# Altium footprint library 电感.PcbLib: 109 footprints (part 5 of 7)
Each footprint in its own frame and in the unit in brackets; x right, y up, seen from the top. Pads: shape width x height; smd on the part's side, far side on the other; paste and mask are expansions set on the pad; w line width, h text height; cw(c..) or ccw(c..) is an arc to the next point about the centre after c.
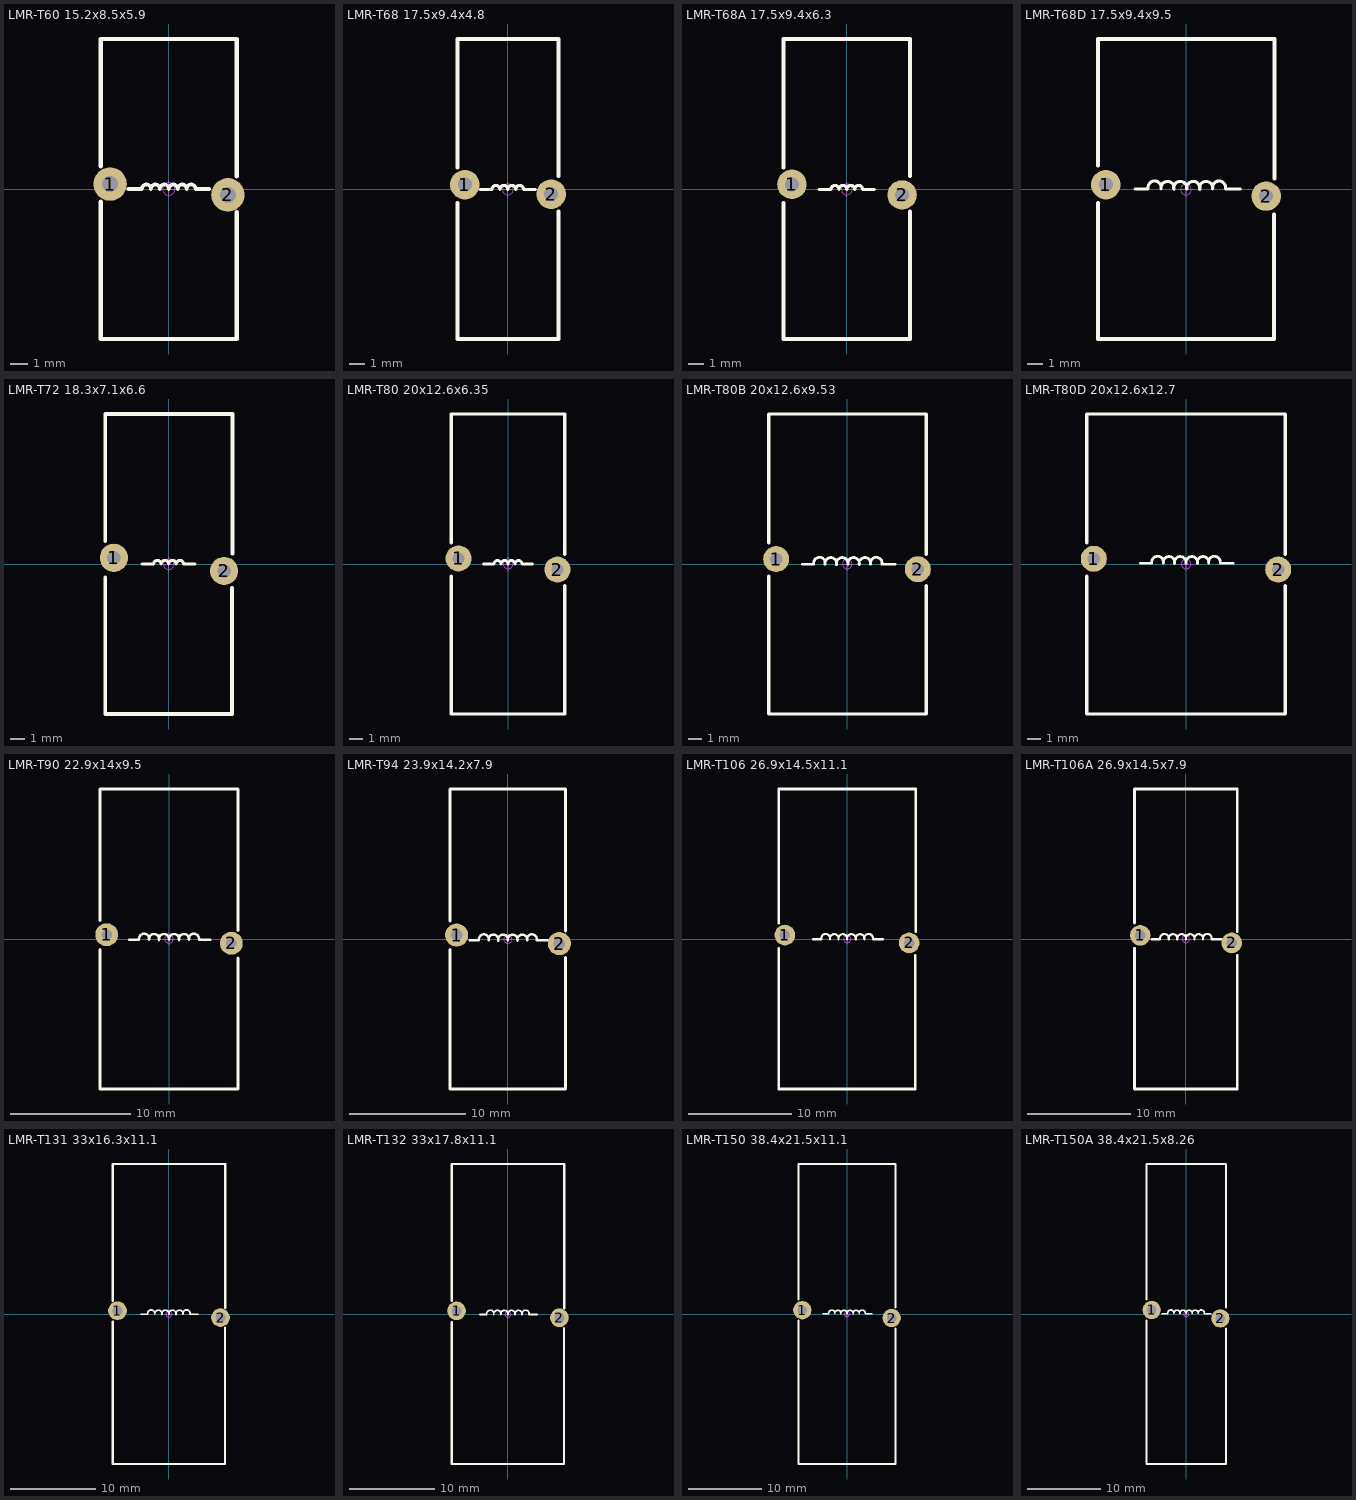
[diagram p4: the footprints below, top view; thin cyan lines are the x and y axes]

## LMR-T60 15.2x8.5x5.9 [mm] "磁环  外：15.2mm，内：8.5mm，厚：5.9mm"
pads (2):
  round 1.9 hole 0.9: 1(-3.327,0.279) 2(3.353,-0.33)
Top Overlay:
  lines w0.203: -2.286,0 -1.524,0 cw(c-1.27,0) -1.016,0 cw(c-0.762,0) -0.508,0 cw(c-0.254,0) 0,0 cw(c0.254,0) 0.508,0 cw(c0.762,0) 1.016,0 cw(c1.27,0) 1.524,0 2.286,0
  lines w0.254: -3.861,-0.711 -3.861,-8.509 3.861,-8.509 3.861,-1.321 ; -3.861,1.295 -3.861,8.509 3.861,8.509 3.861,0.737
Mechanical 15:
  circle w0.05: c0,0 r0.35
  lines w0.05: -0.5,0 0.5,0 ; 0,-0.5 0,0.5
3D body: height 16.81, standoff -2.3, extent -3.711,-8.36 3.711,8.359
3D body: height 0.25, standoff 0, extent 0.33,0.051 0.33,0.051

## LMR-T68 17.5x9.4x4.8 [mm] "磁环  外：17.5mm，内：9.4mm，厚：4.8mm"
pads (2):
  round 1.9 hole 0.9: 1(-2.769,0.305) 2(2.794,-0.305)
Top Overlay:
  lines w0.203: -1.778,0 -1.016,0 cw(c-0.762,0) -0.508,0 cw(c-0.254,0) 0,0 cw(c0.254,0) 0.508,0 cw(c0.762,0) 1.016,0 1.778,0
  lines w0.254: -3.251,-0.889 -3.251,-9.627 3.251,-9.627 3.251,-1.422 ; -3.251,1.422 -3.251,9.677 3.251,9.677 3.251,0.864
Mechanical 15:
  circle w0.05: c0,0 r0.35
  lines w0.05: -0.5,0 0.5,0 ; 0,-0.5 0,0.5
3D body: height 19.11, standoff -2.3, extent -3.161,-9.504 3.162,9.508
3D body: height 0.25, standoff 0, extent 0.33,0.051 0.33,0.051

## LMR-T68A 17.5x9.4x6.3 [mm] "磁环  外：17.5mm，内：9.4mm，厚：6.3mm"
pads (2):
  round 1.9 hole 0.9: 1(-3.531,0.33) 2(3.556,-0.356)
Top Overlay:
  lines w0.203: -1.778,0 -1.016,0 cw(c-0.762,0) -0.508,0 cw(c-0.254,0) 0,0 cw(c0.254,0) 0.508,0 cw(c0.762,0) 1.016,0 1.778,0
  lines w0.254: -4.064,-0.889 -4.064,-9.627 4.064,-9.627 4.064,-1.422 ; -4.064,1.422 -4.064,9.677 4.064,9.677 4.064,0.864
Mechanical 15:
  circle w0.05: c0,0 r0.35
  lines w0.05: -0.5,0 0.5,0 ; 0,-0.5 0,0.5
3D body: height 0.25, standoff 0, extent 0.33,0.051 0.33,0.051
3D body: height 19.11, standoff -2.3, extent -3.911,-9.51 3.913,9.508

## LMR-T68D 17.5x9.4x9.5 [mm] "磁环  外：17.5mm，内：9.4mm，厚：9.5mm"
pads (2):
  round 1.9 hole 0.9: 1(-5.156,0.305) 2(5.156,-0.432)
Top Overlay:
  lines w0.203: -3.262,0.025 -2.442,0.025 ; -2.442,0.048 cw(c-2.024,0.117) -1.611,0.025 cw(c-1.193,0.095) -0.78,0.003 cw(c-0.367,0.095) 0.051,0.025 cw(c0.468,0.095) 0.882,0.003 cw(c1.295,0.095) 1.712,0.025 cw(c2.126,0.117) 2.543,0.048 ; 2.543,0.025 3.49,0.025
  lines w0.254: -5.664,-0.889 -5.664,-9.627 5.664,-9.627 5.664,-1.6 ; -5.664,1.549 -5.664,9.677 5.69,9.677 5.69,0.711
Mechanical 15:
  circle w0.05: c0,0 r0.35
  lines w0.05: -0.5,0 0.5,0 ; 0,-0.5 0,0.5
3D body: height 19.11, standoff -2.32, extent -5.512,-9.509 5.511,9.509
3D body: height 0.25, standoff 0, extent 0.33,0.051 0.33,0.051

## LMR-T72 18.3x7.1x6.6 [mm] "磁环  外：18.3mm，内：7.1mm，厚：6.6mm"
pads (2):
  round 1.9 hole 0.9: 1(-3.683,0.432) 2(3.734,-0.457)
Top Overlay:
  lines w0.203: -1.778,0 -1.016,0 cw(c-0.762,0) -0.508,0 cw(c-0.254,0) 0,0 cw(c0.254,0) 0.508,0 cw(c0.762,0) 1.016,0 1.778,0
  lines w0.254: -4.267,-0.889 -4.267,-10.084 4.267,-10.084 4.267,-1.6 ; -4.267,1.549 -4.267,10.109 4.293,10.109 4.293,0.711
Mechanical 15:
  circle w0.05: c0,0 r0.35
  lines w0.05: -0.5,0 0.5,0 ; 0,-0.5 0,0.5
3D body: height 19.95, standoff -2.3, extent -4.111,-9.936 4.117,9.949
3D body: height 0.25, standoff 0, extent 0.33,0.051 0.33,0.051

## LMR-T80 20x12.6x6.35 [mm] "磁环  外：20mm，内：12.6mm，厚：6.3mm"
pads (2):
  round 1.9 hole 0.9: 1(-3.607,0.406) 2(3.607,-0.406)
Top Overlay:
  lines w0.203: -1.778,0 -1.016,0 cw(c-0.762,0) -0.508,0 cw(c-0.254,0) 0,0 cw(c0.254,0) 0.508,0 cw(c0.762,0) 1.016,0 1.778,0
  lines w0.254: -4.14,-0.889 -4.14,-10.947 4.14,-10.947 4.14,-1.6 ; -4.14,1.549 -4.14,10.947 4.14,10.947 4.14,0.711
Mechanical 15:
  circle w0.05: c0,0 r0.35
  lines w0.05: -0.5,0 0.5,0 ; 0,-0.5 0,0.5
3D body: height 21.71, standoff -2.3, extent -3.987,-10.808 3.986,10.809
3D body: height 0.25, standoff 0, extent 0.33,0.051 0.33,0.051

## LMR-T80B 20x12.6x9.53 [mm] "磁环  外：20mm，内：12.6mm，厚：9.5mm"
pads (2):
  round 1.9 hole 0.9: 1(-5.182,0.356) 2(5.156,-0.381)
Top Overlay:
  lines w0.203: -3.262,-0.025 -2.442,-0.025 ; -2.442,-0.003 cw(c-2.024,0.066) -1.611,-0.025 cw(c-1.193,0.044) -0.78,-0.048 cw(c-0.367,0.044) 0.051,-0.025 cw(c0.468,0.044) 0.882,-0.048 cw(c1.295,0.044) 1.712,-0.025 cw(c2.126,0.066) 2.543,-0.003 ; 2.543,-0.025 3.49,-0.025
  lines w0.254: -5.74,-0.889 -5.74,-10.947 5.766,-10.947 5.766,-1.6 ; -5.74,1.549 -5.74,10.947 5.766,10.947 5.766,0.711
Mechanical 15:
  circle w0.05: c0,0 r0.35
  lines w0.05: -0.5,0 0.5,0 ; 0,-0.5 0,0.5
3D body: height 0.25, standoff 0, extent 0.33,0.051 0.33,0.051
3D body: height 21.69, standoff -2.3, extent -5.578,-10.809 5.576,10.809

## LMR-T80D 20x12.6x12.7 [mm] "磁环  外：20mm，内：12.6mm，厚：12.7mm"
pads (2):
  round 1.9 hole 0.9: 1(-6.731,0.381) 2(6.731,-0.406)
Top Overlay:
  lines w0.203: -3.313,0.051 -2.492,0.051 ; -2.492,0.073 cw(c-2.075,0.143) -1.662,0.051 cw(c-1.244,0.12) -0.831,0.029 cw(c-0.418,0.12) 0,0.051 cw(c0.418,0.12) 0.831,0.029 cw(c1.244,0.12) 1.662,0.051 cw(c2.075,0.143) 2.492,0.073 ; 2.492,0.051 3.44,0.051
  lines w0.254: -7.239,-0.889 -7.239,-10.947 7.239,-10.947 7.239,-1.6 ; -7.239,1.549 -7.239,10.947 7.239,10.947 7.239,0.711
Mechanical 15:
  circle w0.05: c0,0 r0.35
  lines w0.05: -0.5,0 0.5,0 ; 0,-0.5 0,0.5
3D body: height 0.25, standoff 0, extent 0.33,0.051 0.33,0.051
3D body: height 21.59, standoff -2.3, extent -7.111,-10.759 7.111,10.759

## LMR-T90 22.9x14x9.5 [mm] "磁环  外：22.9mm，内：14mm，厚：9.5mm"
pads (2):
  round 1.9 hole 0.9: 1(-5.182,0.356) 2(5.182,-0.356)
Top Overlay:
  lines w0.203: -3.313,-0.076 -2.492,-0.076 ; -2.492,-0.054 cw(c-2.075,0.016) -1.662,-0.076 cw(c-1.244,-0.007) -0.831,-0.098 cw(c-0.418,-0.007) 0,-0.076 cw(c0.418,-0.007) 0.831,-0.098 cw(c1.244,-0.007) 1.662,-0.076 cw(c2.075,0.016) 2.492,-0.054 ; 2.492,-0.076 3.44,-0.076
  lines w0.254: -5.74,-0.889 -5.74,-12.471 5.74,-12.471 5.74,-1.6 ; -5.74,1.549 -5.74,12.471 5.74,12.471 5.74,0.711
Mechanical 15:
  circle w0.05: c0,0 r0.35
  lines w0.05: -0.5,0 0.5,0 ; 0,-0.5 0,0.5
3D body: height 0.25, standoff 0, extent 0.33,0.051 0.33,0.051
3D body: height 24.71, standoff -2.3, extent -5.614,-12.31 5.613,12.31

## LMR-T94 23.9x14.2x7.9 [mm] "磁环  外：23.9mm，内：14.2mm，厚：7.9mm"
pads (2):
  round 2 hole 1: 1(-4.42,0.356) 2(4.445,-0.381)
Top Overlay:
  lines w0.203: -3.313,-0.102 -2.492,-0.102 ; -2.492,-0.079 cw(c-2.075,-0.01) -1.662,-0.102 cw(c-1.244,-0.032) -0.831,-0.124 cw(c-0.418,-0.032) 0,-0.102 cw(c0.418,-0.032) 0.831,-0.124 cw(c1.244,-0.032) 1.662,-0.102 cw(c2.075,-0.01) 2.492,-0.079 ; 2.492,-0.102 3.44,-0.102
  lines w0.254: -4.978,-0.889 -4.978,-12.929 4.978,-12.929 4.978,-1.6 ; -4.978,1.549 -4.978,12.954 4.978,12.954 4.978,0.711
Mechanical 15:
  circle w0.05: c0,0 r0.35
  lines w0.05: -0.5,0 0.5,0 ; 0,-0.5 0,0.5
3D body: height 25.73, standoff -2.3, extent -4.862,-12.803 4.857,12.816
3D body: height 0.25, standoff 0, extent 0.33,0.051 0.33,0.051

## LMR-T106 26.9x14.5x11.1 [mm] "磁环  外：26.9mm，内：14.5mm，厚：11.1mm"
pads (2):
  round 2 hole 1: 1(-6.02,0.381) 2(5.994,-0.381)
Top Overlay:
  lines w0.203: -3.313,-0.025 -2.492,-0.025 ; -2.492,-0.003 cw(c-2.075,0.066) -1.662,-0.025 cw(c-1.244,0.044) -0.831,-0.048 cw(c-0.418,0.044) 0,-0.025 cw(c0.418,0.044) 0.831,-0.048 cw(c1.244,0.044) 1.662,-0.025 cw(c2.075,0.066) 2.492,-0.003 ; 2.492,-0.025 3.44,-0.025
  lines w0.254: -6.604,-0.889 -6.604,-14.503 6.604,-14.503 6.604,-1.6 ; -6.604,1.549 -6.604,14.503 6.629,14.503 6.629,0.711
Mechanical 15:
  circle w0.05: c0,0 r0.35
  lines w0.05: -0.5,0 0.5,0 ; 0,-0.5 0,0.5
3D body: height 28.81, standoff -2.3, extent -6.461,-14.36 6.463,14.36
3D body: height 0.25, standoff 0, extent 0.33,0.051 0.33,0.051

## LMR-T106A 26.9x14.5x7.9 [mm] "磁环  外：26.9mm，内：14.5mm，厚：7.9mm"
pads (2):
  round 2 hole 1: 1(-4.42,0.356) 2(4.445,-0.381)
Top Overlay:
  lines w0.203: -3.313,-0.025 -2.492,-0.025 ; -2.492,-0.003 cw(c-2.075,0.066) -1.662,-0.025 cw(c-1.244,0.044) -0.831,-0.048 cw(c-0.418,0.044) 0,-0.025 cw(c0.418,0.044) 0.831,-0.048 cw(c1.244,0.044) 1.662,-0.025 cw(c2.075,0.066) 2.492,-0.003 ; 2.492,-0.025 3.44,-0.025
  lines w0.254: -4.978,-0.889 -4.978,-14.529 4.978,-14.529 4.978,-1.6 ; -4.978,1.549 -4.978,14.529 4.978,14.529 4.978,0.711
Mechanical 15:
  circle w0.05: c0,0 r0.35
  lines w0.05: -0.5,0 0.5,0 ; 0,-0.5 0,0.5
3D body: height 0.25, standoff 0, extent 0.33,0.051 0.33,0.051
3D body: height 28.81, standoff -2.3, extent -4.861,-14.36 4.863,14.359

## LMR-T131 33x16.3x11.1 [mm] "磁环  外：33mm，内：16.3mm，厚：11.1mm"
pads (2):
  round 2.2 hole 1.2: 1(-6.045,0.406) 2(6.071,-0.406)
Top Overlay:
  lines w0.203: -3.313,-0.025 -2.492,-0.025 ; -2.492,-0.003 cw(c-2.075,0.066) -1.662,-0.025 cw(c-1.244,0.044) -0.831,-0.048 cw(c-0.418,0.044) 0,-0.025 cw(c0.418,0.044) 0.831,-0.048 cw(c1.244,0.044) 1.662,-0.025 cw(c2.075,0.066) 2.492,-0.003 ; 2.492,-0.025 3.44,-0.025
  lines w0.254: -6.604,-0.889 -6.604,-17.628 6.604,-17.628 6.604,-1.6 ; -6.604,1.549 -6.604,17.653 6.629,17.653 6.629,0.711
Mechanical 15:
  circle w0.05: c0,0 r0.35
  lines w0.05: -0.5,0 0.5,0 ; 0,-0.5 0,0.5
3D body: height 0.25, standoff 0, extent 0.33,0.051 0.33,0.051
3D body: height 35.08, standoff -2.3, extent -6.561,-17.505 6.561,17.501

## LMR-T132 33x17.8x11.1 [mm] "磁环  外：33mm，内：17.8mm，厚：11.1mm"
pads (2):
  round 2.2 hole 1.2: 1(-6.045,0.406) 2(6.071,-0.406)
Top Overlay:
  lines w0.203: -3.313,-0.025 -2.492,-0.025 ; -2.492,-0.003 cw(c-2.075,0.066) -1.662,-0.025 cw(c-1.244,0.044) -0.831,-0.048 cw(c-0.418,0.044) 0,-0.025 cw(c0.418,0.044) 0.831,-0.048 cw(c1.244,0.044) 1.662,-0.025 cw(c2.075,0.066) 2.492,-0.003 ; 2.492,-0.025 3.44,-0.025
  lines w0.254: -6.604,-0.889 -6.604,-17.628 6.604,-17.628 6.604,-1.6 ; -6.604,1.549 -6.604,17.704 6.629,17.704 6.629,0.711
Mechanical 15:
  circle w0.05: c0,0 r0.35
  lines w0.05: -0.5,0 0.5,0 ; 0,-0.5 0,0.5
3D body: height 35.14, standoff -2.3, extent -6.634,-17.545 6.62,17.544
3D body: height 0.25, standoff 0, extent 0.33,0.051 0.33,0.051

## LMR-T150 38.4x21.5x11.1 [mm] "磁环  外：38.4mm，内：21.5mm，厚：11.1mm"
pads (2):
  round 2.5 hole 1.3: 1(-6.096,0.533) 2(6.096,-0.533)
Top Overlay:
  lines w0.203: -3.313,0.025 -2.492,0.025 ; -2.492,0.048 cw(c-2.075,0.117) -1.662,0.025 cw(c-1.244,0.095) -0.831,0.003 cw(c-0.418,0.095) 0,0.025 cw(c0.418,0.095) 0.831,0.003 cw(c1.244,0.095) 1.662,0.025 cw(c2.075,0.117) 2.492,0.048 ; 2.492,0.025 3.44,0.025
  lines w0.254: -6.604,-0.889 -6.604,-20.447 6.604,-20.447 6.604,-1.956 ; -6.604,1.981 -6.604,20.472 6.629,20.472 6.629,0.889
Mechanical 15:
  circle w0.05: c0,0 r0.35
  lines w0.05: -0.5,0 0.5,0 ; 0,-0.5 0,0.5
3D body: height 0.25, standoff 0, extent 0.33,0.051 0.33,0.051
3D body: height 40.71, standoff -2.3, extent -6.661,-20.28 6.661,20.278

## LMR-T150A 38.4x21.5x8.26 [mm] "磁环  外：38.4mm，内：21.5mm，厚：8.26mm"
pads (2):
  round 2.5 hole 1.3: 1(-4.699,0.559) 2(4.674,-0.584)
Top Overlay:
  lines w0.203: -3.313,0.051 -2.492,0.051 ; -2.492,0.073 cw(c-2.075,0.143) -1.662,0.051 cw(c-1.244,0.12) -0.831,0.029 cw(c-0.418,0.12) 0,0.051 cw(c0.418,0.12) 0.831,0.029 cw(c1.244,0.12) 1.662,0.051 cw(c2.075,0.143) 2.492,0.073 ; 2.492,0.051 3.44,0.051
  lines w0.254: -5.41,-0.889 -5.41,-20.447 5.436,-20.447 5.436,-1.956 ; -5.41,1.981 -5.41,20.472 5.436,20.472 5.436,0.889
Mechanical 15:
  circle w0.05: c0,0 r0.35
  lines w0.05: -0.5,0 0.5,0 ; 0,-0.5 0,0.5
3D body: height 40.76, standoff -2.3, extent -5.278,-20.313 5.292,20.326
3D body: height 0.25, standoff 0, extent 0.33,0.051 0.33,0.051